# Altium integrated library SJ Passive Components.IntLib: 53 symbols
Pins are listed as number, name and electrical type; pins without a type are passive.

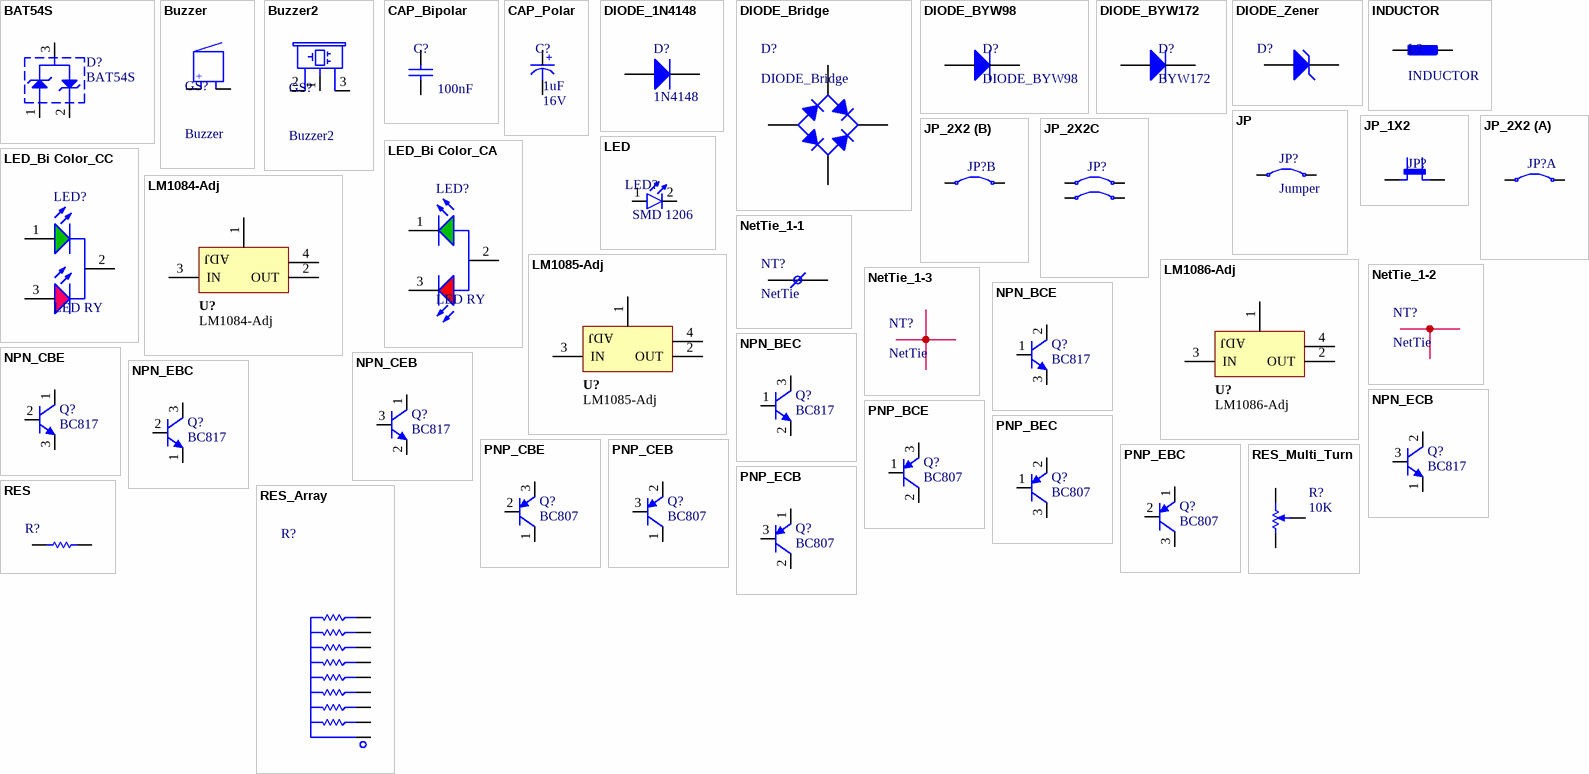
[diagram p0: symbols BAT54S to RES_Multi_Turn]

## BAT54S
designator D?
Schottky Barrier Double Diode; Company: SJ Libraries; Designer: Eng. Saeid Jorablo; Category: Diodes; ComponentLink1Description: Datasheet; ComponentLink2Description: Reference; ComponentLink2URL: http://altium-library.ir; HelpURL: http://s3.picofile.com/file/7443264187/Coming_Soon_logo.gif; Mounting Technology: Surface Mount; PackageDescription: SOT-23; 3 Leads; Body 3.0 x 2.6 mm, inc. leads (LxW max); PackageReference: SOT-23; Pin Count: 3; Publisher: SJ Unlimited; Status: Unreleased; Value: BAT54S
footprint SOT23_BEC_N (SOT23, 3-Leads, Body 2.9x1.3mm, Pitch 0.95mm, Lead Span 2.4mm, IPC Medium Density)
footprint SOT23_BEC_L (SOT23, 3-Leads, Body 2.9x1.3mm, Pitch 0.95mm, Lead Span 2.4mm, IPC High Density)
footprint SOT23_BEC_M (SOT23, 3-Leads, Body 2.9x1.3mm, Pitch 0.95mm, Lead Span 2.4mm, IPC Low Density)
signal-integrity model BAT54S
pins: 1 "Not Connected", 2 "Not Connected", 3 "Not Connected"

## Buzzer
designator GS?
Magnetic Transducer Buzzer; Company: SJ Libraries; Designer: Eng. Saeid Jorablo; PackageReference: ABSM-1574; PackageDescription: Magnetic Transducer Buzzer; Mounting Technology: Surface Mount\Through-Hole; ComponentLink1Description: Datasheet; Pin Count: 0; Category: MISC; HelpURL: http://s3.picofile.com/file/7443264187/Coming_Soon_logo.gif; ComponentLink2Description: Reference; Publisher: SJ Unlimited; Status: Unreleased
footprint BZ_SJ
footprint BZ_ABSM-1574 (Footprint not found)
footprint BZ_B/C11L
footprint BZ_B/C11S
footprint BZ_B/C14L
footprint BZ_B/C14S
footprint BZ_B/C17L
footprint BZ_B/C17S
footprint BZ_BMT1205XH7.5
footprint BZ_BPT-24X
footprint BZ_EB2209A
footprint BZ_EB2505
footprint BZ_EFBAA40D101
footprint BZ_EFBRD22C41
footprint BZ_EFBRD22C413
footprint BZ_EFBRD24C411
footprint BZ_F/BC35
footprint BZ_F/BC40
footprint BZ_F/CM04P
footprint BZ_F/CM12P
footprint BZ_F/DB18
footprint BZ_F/EB20P
footprint BZ_F/EE17P
footprint BZ_F/EE21P
footprint BZ_F/HGP
footprint BZ_F/HMB
footprint BZ_F/QMB
footprint BZ_F/QMBIII
footprint BZ_F/QMX
footprint BZ_F/TMB
pins: 1 + "Positive Pin", 2 - "Negative Pin"
4 alternate drawings of the same symbol

## Buzzer2
designator GS?
Magnetic Transducer Buzzer; Company: SJ Libraries; Designer: Eng. Saeid Jorablo; PackageReference: ABSM-1574; PackageDescription: Magnetic Transducer Buzzer; Mounting Technology: Surface Mount\Through-Hole; ComponentLink1Description: Datasheet; Pin Count: 0; Category: MISC; HelpURL: http://s3.picofile.com/file/7443264187/Coming_Soon_logo.gif; ComponentLink2Description: Reference; Publisher: SJ Unlimited; Status: Unreleased
footprint BZ_F/SU (BUZZER  Source: Spoerle)
footprint BZ_F/KMB (BUZZER  Source: Buerklin)
footprint BZ_F/CMB (BUZZER  Source: Buerklin)
pins: 1 C, 2 +, 3 -
1 alternate drawing of the same symbol

## CAP_Bipolar
designator C?, comment 100nF
Bipolar Capacitor; Voltage: 100V; Designer: Eng. Saeid Jorablo; Company: SJ Libraries; ComponentLink1Description: Datasheet; ComponentLink2Description: Reference; Publisher: SJ Unlimited; Mounting Technology: *; Mounting Technology: Surface Mount\Through-Hole; HelpURL: http://s3.picofile.com/file/7443264187/Coming_Soon_logo.gif; Status: Unreleased; Value: 100nF
footprint Cap - 100nF
signal-integrity model Cap (Bipolar Cap)
footprint Cap - 100nF - 2
footprint CAPC1005L (0402) (Chip Capacitor, Body 1.0x0.5mm, IPC High Density)
footprint CAPC1005M (0402) (Chip Capacitor, Body 1.0x0.5mm, IPC Low Density)
footprint CAPC1005N (0402) (Chip Capacitor, Body 1.0x0.5mm, IPC Medium Density)
footprint CAPC1608L (0603) (Chip Capacitor, Body 1.6x0.8mm, IPC High Density)
footprint CAPC1608M (0603) (Chip Capacitor, Body 1.6x0.8mm, IPC Low Density)
footprint CAPC1608N (0603) (Chip Capacitor, Body 1.6x0.8mm, IPC Medium Density)
footprint CAPC2012L (0805) (Chip Capacitor, Body 2.0x1.3mm, IPC High Density)
footprint CAPC2012M (0805) (Chip Capacitor, Body 2.0x1.3mm, IPC Low Density)
footprint CAPC2012N (0805) (Chip Capacitor, Body 2.0x1.3mm, IPC Medium Density)
footprint CAPC3216L (1206) (Chip Capacitor, Body 3.2x1.6mm, IPC High Density)
footprint CAPC3216M (1206) (Chip Capacitor, Body 3.2x1.6mm, IPC Low Density)
footprint CAPC3216N (1206) (Chip Capacitor, Body 3.2x1.6mm, IPC Medium Density)
footprint CAPC3225L (1210) (Chip Capacitor, Body 3.2x2.5mm, IPC High Density)
footprint CAPC3225M (1210) (Chip Capacitor, Body 3.2x2.5mm, IPC Low Density)
footprint CAPC3225N (1210) (Chip Capacitor, Body 3.2x2.5mm, IPC Medium Density)
pins: 1 +, 2 -

## CAP_Polar
designator C?, comment Voltage: 16V  (hidden comment: 1uF)
Polar Capacitor; Designer: Eng. Saeid Jorablo; Company: SJ Libraries; ComponentLink1Description: Datasheet; ComponentLink2Description: Reference; Publisher: SJ Unlimited; Mounting Technology: Surface Mount\Through-Hole; HelpURL: http://s3.picofile.com/file/7443264187/Coming_Soon_logo.gif; Status: Unreleased; Value: 1uF
footprint cap 00
footprint cap 01
footprint cap 02
footprint cap 03
footprint cap 04
footprint CAP 05
footprint CAPP 1206 (3216X18L) Size A (Chip Capacitor, 2-Leads, Body 3.2x1.6mm, IPC High Density, chip Tantalum)
signal-integrity model Cap (Polar Capacitor)
pins: 1 +, 2 -

## DIODE_1N4148
designator D?, comment 1N4148
High Conductance Fast Diode; Designer: Eng. Saeid Jorablo; Company: SJ Libraries; Published: 8-Jun-2000; LatestRevisionDate: 17-Jul-2002; LatestRevisionNote: Re-released for DXP Platform.; PackageReference: DO-35; Publisher: SJ Unlimited; PackageDescription: Diode, Axial; Body 3.8 x 1.9 mm (LxDia. max), Lead Dia. 0.53 mm (max); Code_JEDEC: DO-204-AH; ComponentLink1Description: Datasheet; ComponentLink1URL: http://www.fairchildsemi.com/; ComponentLink2Description: Reference; ComponentLink2URL: http://www.fairchildsemi.com/ds/1N%2F1N4148.pdf; Mounting Technology: Surface Mount\Through-Hole; HelpURL: http://s3.picofile.com/file/7443264187/Coming_Soon_logo.gif; Status: Unreleased
footprint DO-35 (Diode, Axial; Body 3.8 x 1.9 mm (LxDia. max), Lead Dia. 0.53 mm (max))
footprint LL4148 (MELF Diode, 2-Leads, Body 3.5x1.4mm, IPC Medium Density)
pins: 1 A, 2 K

## DIODE_Bridge
designator D?
Full Wave Diode Bridge; Company: SJ Libraries; Designer: Eng. Saeid Jorablo; Design Date: 2011/11/02; ComponentLink1Description: Datasheet; ComponentLink2Description: Reference; Publisher: SJ Unlimited; Mounting Technology: Surface Mount\Through-Hole; HelpURL: http://s3.picofile.com/file/7443264187/Coming_Soon_logo.gif; Status: Unreleased
footprint Bridge
footprint Diode Bridge
pins: 1 K, 2 C, 3 A, 4 C

## DIODE_BYW98
designator D?
HIGH EFFICIENCY FAST RECOVERY RECTIFIER DIODES; Designer: Eng. Saeid Jorablo; Company: SJ Libraries; IF(av): 3 A; Vrrm: 200 V; Trr (max): 35 ns; ComponentLink1Description: Datasheet; ComponentLink2Description: Reference; Publisher: SJ Unlimited; Mounting Technology: Surface Mount\Through-Hole; HelpURL: http://s3.picofile.com/file/7443264187/Coming_Soon_logo.gif; Status: Unreleased
footprint BYW98
pins: 1 A, 2 K

## DIODE_BYW172
designator D?, comment BYW172
Fast Avalanche Sinterglass Diode; 3A IF; VR 400V; Designer: Eng. Saeid Jorablo; Company: SJ Libraries; Vrrm: 200 V; Trr (max): 35 ns; IF(av): 3 A; ComponentLink1Description: Datasheet; ComponentLink2Description: Reference; Publisher: SJ Unlimited; Mounting Technology: Surface Mount\Through-Hole; HelpURL: http://s3.picofile.com/file/7443264187/Coming_Soon_logo.gif; Status: Unreleased
footprint BYW172
pins: 1 A, 2 K

## DIODE_Zener
designator D?  (value not drawn)
Zener Diode; Designer: Eng. Saeid Jorablo; Company: SJ Libraries; Voltage: 3.3 V; Design Date: 2011/11/02; ComponentLink1Description: Datasheet; ComponentLink2Description: Reference; Publisher: SJ Unlimited; Mounting Technology: Surface Mount\Through-Hole; HelpURL: http://s3.picofile.com/file/7443264187/Coming_Soon_logo.gif; Status: Unreleased
footprint Diode 1W
footprint Diode 1W_Stand
pins: 1 A, 2 K

## INDUCTOR
designator L?
Code_IEC: 1005; Designer: Eng. Saeid Jorablo; Company: SJ Libraries; Value: 10mH; Published: 8-Jun-2000; LatestRevisionDate: 29-May-2009; LatestRevisionNote: IPC-7351 Footprint Added.; PackageReference: 0402-A; Publisher: SJ Unlimited; PackageDescription: Chip Inductor; Code_JEITA: 0402; ComponentLink1Description: Datasheet; ComponentLink2Description: Reference; Mounting Technology: Surface Mount\Through-Hole; HelpURL: http://s3.picofile.com/file/7443264187/Coming_Soon_logo.gif; Status: Unreleased
footprint 0402-A (Chip Inductor, Body 1.0x0.5mm, IPC High Density)
footprint INDC1608L (Chip Inductor, Body 1.6x0.8mm, IPC High Density)
footprint 2029 (Chip Inductor, Body 2.0x1.2mm, IPC High Density)
footprint 0603 (Chip Inductor, Body 0.6x0.3mm, IPC High Density)
footprint INDC3216 (Chip Inductor, Body 3.2x1.6mm, IPC High Density)
footprint INDC4532 (Chip Inductor, Body 4.5x3.2mm, IPC High Density)
signal-integrity model Inductor
pins: 1, 2

## JP
designator JP?, comment Jumper
Jumper Component; Company: SJ Libraries; Designer: Eng. Saeid Jorablo; Category: Jumpers; ComponentLink1Description: Datasheet; ComponentLink2Description: Reference; HelpURL: http://s3.picofile.com/file/7443264187/Coming_Soon_logo.gif; Mounting Technology: Surface Mount\Through-Hole; Pin Count: 2; Publisher: SJ Unlimited; Status: Unreleased
footprint J0R/10 (0 Ohm Jumper Resistor)
footprint JP254_H (Jumper Header 2.54mm Pitch, Horizontal)
footprint JP254_V (Jumper Header 2.54mm Pitch, Vertical)
footprint SJ (SMD Jumper)
footprint SJW (SMD Jumper Wide)
footprint J0508-200 (5.08 mm (200mil) Jumper wire)
footprint J0762-300 (7.62 mm (300 mil) Jumper wire)
footprint J1016-400 (10.16 mm (400 mil) Jumper wire)
footprint J1270-500 (12.7 mm (500 mil) Jumper wire)
footprint J1524-600 (15.24 mm (600 mil) Jumper wire)
footprint J2032-800 (20.32 mm (800 mil) Jumper wire)
footprint J2540-1000 (25.4 mm (1000 mil) Jumper wire)
footprint J3048-1200 (30.48 mm (1200 mil) Jumper wire)
pins: 1, 2
4 alternate drawings of the same symbol

## JP_1X2
designator JP?, comment Jumper  (value not drawn)
1 X 02 Jumper; Company: SJ Libraries; Designer: Eng. Saeid Jorablo; Category: Jumpers; ComponentLink1Description: Datasheet; ComponentLink2Description: Reference; HelpURL: http://s3.picofile.com/file/7443264187/Coming_Soon_logo.gif; Mounting Technology: Surface Mount\Through-Hole; Pin Count: 2; Publisher: SJ Unlimited; Status: Unreleased
footprint JP254_H (Jumper Header 2.54mm Pitch, Horizontal)
footprint JP254_V (Jumper Header 2.54mm Pitch, Vertical)
pins: 1, 2
2 alternate drawings of the same symbol

## JP_2X2
designator JP?, comment Jumper  (value not drawn)
2 X 2 Jumper; Company: SJ Libraries; Designer: Eng. Saeid Jorablo; Category: Jumpers; ComponentLink1Description: Datasheet; ComponentLink2Description: Reference; HelpURL: http://s3.picofile.com/file/7443264187/Coming_Soon_logo.gif; Mounting Technology: Surface Mount\Through-Hole; Pin Count: 4; Publisher: SJ Unlimited; Status: Unreleased
footprint MHDR2X02-254P - E (Male Header 2X02 with 2.54 mm Pitch)
footprint MHDR2X02-200P - E (Male Header 2X02 with 2.00 mm Pitch)
part A pins: 1, 2
part B pins: 3, 4
2 alternate drawings of the same symbol

## JP_2X2C
designator JP?, comment Jumper  (value not drawn)
2 X 2 Jumper; Company: SJ Libraries; Designer: Eng. Saeid Jorablo; Category: Jumpers; ComponentLink1Description: Datasheet; ComponentLink2Description: Reference; HelpURL: http://s3.picofile.com/file/7443264187/Coming_Soon_logo.gif; Mounting Technology: Surface Mount\Through-Hole; Pin Count: 4; Publisher: SJ Unlimited; Status: Unreleased
footprint MHDR2X02-254P - E (Male Header 2X02 with 2.54 mm Pitch)
footprint MHDR2X02-200P - E (Male Header 2X02 with 2.00 mm Pitch)
pins: 1, 2, 3, 4
1 alternate drawing of the same symbol

## LED
designator LED?, comment Size: SMD 1206  (hidden comment: Red)
LED; Designer: Eng. Saeid Jorablo; Company: SJ Libraries; ComponentLink1Description: Datasheet; ComponentLink2Description: Reference; Publisher: SJ Unlimited; Mounting Technology: Surface Mount\Through-Hole; Color: Red; HelpURL: http://s3.picofile.com/file/7443264187/Coming_Soon_logo.gif; Status: Unreleased
footprint LED-3mm
footprint LED-5mm
footprint LED SMD 1206
footprint LED-RED (LED 3mm Right Angle - Color Red)
footprint LED-GREEN (LED 3mm Right Angle - Color Green)
footprint LED-YELLOW (LED 3mm Right Angle - Color Yellow)
footprint SMD_LED_0603_GREEN
footprint SMD_LED_0603_RED
footprint SMD_LED_0603_ORANGE
footprint SMD_LED_0603_YELLOW
pins: 1 A, 2 K
5 alternate drawings of the same symbol

## LED_Bi Color_CA
designator LED?, comment LED RY
Dual LED - Common Anode; Designer: Eng. Saeid Jorablo; Company: SJ Libraries; ComponentLink1Description: Datasheet; ComponentLink2Description: Reference; Publisher: SJ Unlimited; Mounting Technology: Surface Mount\Through-Hole; HelpURL: http://s3.picofile.com/file/7443264187/Coming_Soon_logo.gif; Status: Unreleased
pins: 1 A1, 2 K, 3 A2

## LED_Bi Color_CC
designator LED?, comment LED RY
Dual LED - Common Cothode; Designer: Eng. Saeid Jorablo; Company: SJ Libraries; ComponentLink1Description: Datasheet; ComponentLink2Description: Reference; Publisher: SJ Unlimited; Mounting Technology: Surface Mount\Through-Hole; HelpURL: http://s3.picofile.com/file/7443264187/Coming_Soon_logo.gif; Status: Unreleased
pins: 1 A1, 2 K, 3 A2

## LM1084-Adj
designator U?
LM1084-Adj, 5A Low Dropout Positive Adjustable Regulator; Max Input Voltage: 12V; Max Output Current: 5.1A; Max Output Voltage: mV; Min Input Voltage: -0.3V; Min Output Voltage: mV; Mounting Technology: Surface Mount; Status: Unreleased; Supply Voltage: mV; Temperature Range: -40 - 125 degC; Category: IC-Power
footprint TO254P-3N
pins: 1 ADJ, 2 OUT (power), 3 IN (power), 4 TAP

## LM1085-Adj
designator U?
LM1085-Adj, 3A Low Dropout Positive Adjustable Regulator; Max Input Voltage: 12V; Max Output Voltage: mV; Min Input Voltage: -0.3V; Max Output Current: 3A; Min Output Voltage: mV; Mounting Technology: Surface Mount; Status: Unreleased; Supply Voltage: mV; Temperature Range: -40 - 125 degC; Category: IC-Power
footprint TO254P-3N
pins: 1 ADJ, 2 OUT (power), 3 IN (power), 4

## LM1086-Adj
designator U?
LM1086-Adj, 1.5A Low Dropout Positive Adjustable Regulator; Max Input Voltage: 12V; Max Output Voltage: mV; Min Input Voltage: -0.3V; Max Output Current: 1.5A; Min Output Voltage: mV; Mounting Technology: Surface Mount; Status: Unreleased; Supply Voltage: mV; Temperature Range: -40 - 125 degC; Category: IC-Power
footprint TO254P-3N
pins: 1 ADJ, 2 OUT (power), 3 IN (power), 4

## NetTie_1-1
designator NT?, comment NetTie  (net tie, no BOM)
Net Tie One to One Connection; Company: SJ Libraries; Designer: Eng. Saeid Jorablo; HelpURL: http://s3.picofile.com/file/7443264187/Coming_Soon_logo.gif; ComponentLink1Description: Datasheet; ComponentLink2Description: Reference; Mounting Technology: Surface Mount\Through-Hole; Publisher: SJ Unlimited; Status: Unreleased
footprint NT_1-1_1 (NetTie One to One)
footprint NT_1-1_3 (NetTie One to One)
footprint NT_1-1_1 - small (NetTie One to One)
footprint NT_1-1_3 - small (NetTie One to One)
footprint NT_1X1X01 (NetTie One to One - 0.1mm width)
footprint NT_1X1X02 (NetTie One to One - 0.2mm width)
footprint NT_1X1X03 (NetTie One to One- 0.3mm width)
footprint NT_1X1X04 (NetTie One to One- 0.4mm width)
footprint NT_1X1X05 (NetTie One to One- 0.5mm width)
footprint NT_1X1X06 (NetTie One to One- 0.6mm width)
footprint NT_1X1X07 (NetTie One to One- 0.7mm width)
footprint NT_1X1X08 (NetTie One to One- 0.8mm width)
footprint NT_1X1X09 (NetTie One to One- 0.9mm width)
footprint NT_1X1X10 (NetTie One to One- 1.0mm width)
footprint NT_1X1X12 (NetTie One to One- 1.2mm width)
footprint NT_1X1X15 (NetTie One to One- 1.5mm width)
footprint NT_1X1X20 (NetTie One to One- 2.0mm width)
pins: 1 (power), 2 (power)
1 alternate drawing of the same symbol

## NetTie_1-2
designator NT?, comment NetTie  (net tie, no BOM)
Net Tie One to Two Connection; Company: SJ Libraries; Designer: Eng. Saeid Jorablo; HelpURL: http://s3.picofile.com/file/7443264187/Coming_Soon_logo.gif; ComponentLink1Description: Datasheet; ComponentLink2Description: Reference; Mounting Technology: Surface Mount\Through-Hole; Publisher: SJ Unlimited; Status: Unreleased
footprint NT_1-2_1 (NetTie One to Two)
footprint NT_1-2_2 (NetTie One to Two)
footprint NT_1-2_3 (NetTie One to Two)
footprint NT_1-2_4 (NetTie One to Two)
footprint NT_1-2_5 (NetTie One to Two)
footprint NT_1-2_6 (NetTie One to Two)
footprint NT_1-2_1 - small (NetTie One to Two)
footprint NT_1-2_2 - small (NetTie One to Two)
pins: 1 (power), 2 (power), 3 (power)
1 alternate drawing of the same symbol

## NetTie_1-3
designator NT?, comment NetTie  (net tie, no BOM)
Net Tie One to Two Connection; Company: SJ Libraries; Designer: Eng. Saeid Jorablo; HelpURL: http://s3.picofile.com/file/7443264187/Coming_Soon_logo.gif; ComponentLink1Description: Datasheet; ComponentLink2Description: Reference; Mounting Technology: Surface Mount\Through-Hole; Publisher: SJ Unlimited; Status: Unreleased
footprint NT_1-3_1 (NetTie One to Three)
footprint NT_1-3_1 - small (NetTie One to Two)
footprint NT_1-3_2 (NetTie One to Three)
footprint NT_1-3_2 - small (NetTie One to Two)
footprint NT_1-3_3 (NetTie One to Three)
footprint NT_1-3_4 (NetTie One to Three)
footprint NT_1-3_5 (NetTie One to Two)
pins: 1 (power), 2 (power), 3 (power), 4 (power)
1 alternate drawing of the same symbol

## NPN_BCE
designator Q?, comment BC817
NPN Bipolar Transistor; Designer: Eng. Saeid Jorablo; Company: SJ Libraries; Published: 8-Jun-2000; LatestRevisionDate: 29-May-2009; LatestRevisionNote: IPC-7351 Footprint Added.; PackageVersion: Aug-1999; PackageReference: SOT-23B; Publisher: SJ Unlimited; PackageDescription: 3-Pin SOT-23 Package 0.95 mm Pitch, 2.4 mm Lead Span; ComponentLink1Description: Datasheet; ComponentLink2Description: Reference; Mounting Technology: Surface Mount\Through-Hole; HelpURL: http://s3.picofile.com/file/7443264187/Coming_Soon_logo.gif; Status: Unreleased
footprint SOT23_BEC_L (SOT23, 3-Leads, Body 2.9x1.3mm, Pitch 0.95mm, Lead Span 2.4mm, IPC High Density)
footprint SOT23_BEC_M (SOT23, 3-Leads, Body 2.9x1.3mm, Pitch 0.95mm, Lead Span 2.4mm, IPC Low Density)
footprint SOT23_BEC_N (SOT23, 3-Leads, Body 2.9x1.3mm, Pitch 0.95mm, Lead Span 2.4mm, IPC Medium Density)
signal-integrity model NPN (NPN BJT Transistor)
pins: 1 B, 2 C, 3 E

## NPN_BEC
designator Q?, comment BC817
NPN Bipolar Transistor; Designer: Eng. Saeid Jorablo; Company: SJ Libraries; Published: 8-Jun-2000; LatestRevisionDate: 29-May-2009; LatestRevisionNote: IPC-7351 Footprint Added.; PackageVersion: Aug-1999; PackageReference: SOT-23B; Publisher: SJ Unlimited; PackageDescription: 3-Pin SOT-23 Package 0.95 mm Pitch, 2.4 mm Lead Span; ComponentLink1Description: Datasheet; ComponentLink2Description: Reference; Mounting Technology: Surface Mount\Through-Hole; HelpURL: http://s3.picofile.com/file/7443264187/Coming_Soon_logo.gif; Status: Unreleased
footprint SOT23_BEC_L (SOT23, 3-Leads, Body 2.9x1.3mm, Pitch 0.95mm, Lead Span 2.4mm, IPC High Density)
footprint SOT23_BEC_M (SOT23, 3-Leads, Body 2.9x1.3mm, Pitch 0.95mm, Lead Span 2.4mm, IPC Low Density)
footprint SOT23_BEC_N (SOT23, 3-Leads, Body 2.9x1.3mm, Pitch 0.95mm, Lead Span 2.4mm, IPC Medium Density)
signal-integrity model NPN (NPN BJT Transistor)
pins: 1 B, 2 E, 3 C

## NPN_CBE
designator Q?, comment BC817
NPN Bipolar Transistor; Designer: Eng. Saeid Jorablo; Company: SJ Libraries; Published: 8-Jun-2000; LatestRevisionDate: 29-May-2009; LatestRevisionNote: IPC-7351 Footprint Added.; PackageVersion: Aug-1999; PackageReference: SOT-23B; Publisher: SJ Unlimited; PackageDescription: 3-Pin SOT-23 Package 0.95 mm Pitch, 2.4 mm Lead Span; ComponentLink1Description: Datasheet; ComponentLink2Description: Reference; Mounting Technology: Surface Mount\Through-Hole; HelpURL: http://s3.picofile.com/file/7443264187/Coming_Soon_logo.gif; Status: Unreleased
footprint SOT23_BEC_L (SOT23, 3-Leads, Body 2.9x1.3mm, Pitch 0.95mm, Lead Span 2.4mm, IPC High Density)
footprint SOT23_BEC_M (SOT23, 3-Leads, Body 2.9x1.3mm, Pitch 0.95mm, Lead Span 2.4mm, IPC Low Density)
footprint SOT23_BEC_N (SOT23, 3-Leads, Body 2.9x1.3mm, Pitch 0.95mm, Lead Span 2.4mm, IPC Medium Density)
signal-integrity model NPN (NPN BJT Transistor)
pins: 1 C, 2 B, 3 E

## NPN_CEB
designator Q?, comment BC817
NPN Bipolar Transistor; Designer: Eng. Saeid Jorablo; Company: SJ Libraries; Published: 8-Jun-2000; LatestRevisionDate: 29-May-2009; LatestRevisionNote: IPC-7351 Footprint Added.; PackageVersion: Aug-1999; PackageReference: SOT-23B; Publisher: SJ Unlimited; PackageDescription: 3-Pin SOT-23 Package 0.95 mm Pitch, 2.4 mm Lead Span; ComponentLink1Description: Datasheet; ComponentLink2Description: Reference; Mounting Technology: Surface Mount\Through-Hole; HelpURL: http://s3.picofile.com/file/7443264187/Coming_Soon_logo.gif; Status: Unreleased
footprint SOT23_BEC_L (SOT23, 3-Leads, Body 2.9x1.3mm, Pitch 0.95mm, Lead Span 2.4mm, IPC High Density)
footprint SOT23_BEC_M (SOT23, 3-Leads, Body 2.9x1.3mm, Pitch 0.95mm, Lead Span 2.4mm, IPC Low Density)
footprint SOT23_BEC_N (SOT23, 3-Leads, Body 2.9x1.3mm, Pitch 0.95mm, Lead Span 2.4mm, IPC Medium Density)
signal-integrity model NPN (NPN BJT Transistor)
pins: 1 C, 2 E, 3 B

## NPN_EBC
designator Q?, comment BC817
NPN Bipolar Transistor; Designer: Eng. Saeid Jorablo; Company: SJ Libraries; Published: 8-Jun-2000; LatestRevisionDate: 29-May-2009; LatestRevisionNote: IPC-7351 Footprint Added.; PackageVersion: Aug-1999; PackageReference: SOT-23B; Publisher: SJ Unlimited; PackageDescription: 3-Pin SOT-23 Package 0.95 mm Pitch, 2.4 mm Lead Span; ComponentLink1Description: Datasheet; ComponentLink2Description: Reference; Mounting Technology: Surface Mount\Through-Hole; HelpURL: http://s3.picofile.com/file/7443264187/Coming_Soon_logo.gif; Status: Unreleased
footprint SOT23_BEC_L (SOT23, 3-Leads, Body 2.9x1.3mm, Pitch 0.95mm, Lead Span 2.4mm, IPC High Density)
footprint SOT23_BEC_M (SOT23, 3-Leads, Body 2.9x1.3mm, Pitch 0.95mm, Lead Span 2.4mm, IPC Low Density)
footprint SOT23_BEC_N (SOT23, 3-Leads, Body 2.9x1.3mm, Pitch 0.95mm, Lead Span 2.4mm, IPC Medium Density)
signal-integrity model NPN (NPN BJT Transistor)
pins: 1 E, 2 B, 3 C

## NPN_ECB
designator Q?, comment BC817
NPN Bipolar Transistor; Designer: Eng. Saeid Jorablo; Company: SJ Libraries; Published: 8-Jun-2000; LatestRevisionDate: 29-May-2009; LatestRevisionNote: IPC-7351 Footprint Added.; PackageVersion: Aug-1999; PackageReference: SOT-23B; Publisher: SJ Unlimited; PackageDescription: 3-Pin SOT-23 Package 0.95 mm Pitch, 2.4 mm Lead Span; ComponentLink1Description: Datasheet; ComponentLink2Description: Reference; Mounting Technology: Surface Mount\Through-Hole; HelpURL: http://s3.picofile.com/file/7443264187/Coming_Soon_logo.gif; Status: Unreleased
footprint SOT23_BEC_L (SOT23, 3-Leads, Body 2.9x1.3mm, Pitch 0.95mm, Lead Span 2.4mm, IPC High Density)
footprint SOT23_BEC_M (SOT23, 3-Leads, Body 2.9x1.3mm, Pitch 0.95mm, Lead Span 2.4mm, IPC Low Density)
footprint SOT23_BEC_N (SOT23, 3-Leads, Body 2.9x1.3mm, Pitch 0.95mm, Lead Span 2.4mm, IPC Medium Density)
signal-integrity model NPN (NPN BJT Transistor)
pins: 1 E, 2 C, 3 B

## PNP_BCE
designator Q?, comment BC807
PNP Bipolar Transistor; Designer: Eng. Saeid Jorablo; Company: SJ Libraries; Published: 8-Jun-2000; LatestRevisionDate: 29-May-2009; LatestRevisionNote: IPC-7351 Footprint Added.; PackageVersion: Aug-1999; PackageReference: SOT-23B; Publisher: SJ Unlimited; PackageDescription: 3-Pin SOT-23 Package 0.95 mm Pitch, 2.4 mm Lead Span; ComponentLink1Description: Datasheet; ComponentLink2Description: Reference; Mounting Technology: Surface Mount\Through-Hole; HelpURL: http://s3.picofile.com/file/7443264187/Coming_Soon_logo.gif; Status: Unreleased
signal-integrity model PNP
footprint SOT23_BEC_N (SOT23, 3-Leads, Body 2.9x1.3mm, Pitch 0.95mm, Lead Span 2.4mm, IPC Medium Density)
footprint SOT23_BEC_M (SOT23, 3-Leads, Body 2.9x1.3mm, Pitch 0.95mm, Lead Span 2.4mm, IPC Low Density)
footprint SOT23_BEC_L (SOT23, 3-Leads, Body 2.9x1.3mm, Pitch 0.95mm, Lead Span 2.4mm, IPC High Density)
pins: 1 B, 2 C, 3 E

## PNP_BEC
designator Q?, comment BC807
PNP Bipolar Transistor; Designer: Eng. Saeid Jorablo; Company: SJ Libraries; Published: 8-Jun-2000; LatestRevisionDate: 29-May-2009; LatestRevisionNote: IPC-7351 Footprint Added.; PackageVersion: Aug-1999; PackageReference: SOT-23B; Publisher: SJ Unlimited; PackageDescription: 3-Pin SOT-23 Package 0.95 mm Pitch, 2.4 mm Lead Span; ComponentLink1Description: Datasheet; ComponentLink2Description: Reference; Mounting Technology: Surface Mount\Through-Hole; HelpURL: http://s3.picofile.com/file/7443264187/Coming_Soon_logo.gif; Status: Unreleased
signal-integrity model PNP
footprint SOT23_BEC_N (SOT23, 3-Leads, Body 2.9x1.3mm, Pitch 0.95mm, Lead Span 2.4mm, IPC Medium Density)
footprint SOT23_BEC_M (SOT23, 3-Leads, Body 2.9x1.3mm, Pitch 0.95mm, Lead Span 2.4mm, IPC Low Density)
footprint SOT23_BEC_L (SOT23, 3-Leads, Body 2.9x1.3mm, Pitch 0.95mm, Lead Span 2.4mm, IPC High Density)
pins: 1 B, 2 E, 3 C

## PNP_CBE
designator Q?, comment BC807
PNP Bipolar Transistor; Designer: Eng. Saeid Jorablo; Company: SJ Libraries; Published: 8-Jun-2000; LatestRevisionDate: 29-May-2009; LatestRevisionNote: IPC-7351 Footprint Added.; PackageVersion: Aug-1999; PackageReference: SOT-23B; Publisher: SJ Unlimited; PackageDescription: 3-Pin SOT-23 Package 0.95 mm Pitch, 2.4 mm Lead Span; ComponentLink1Description: Datasheet; ComponentLink2Description: Reference; Mounting Technology: Surface Mount\Through-Hole; HelpURL: http://s3.picofile.com/file/7443264187/Coming_Soon_logo.gif; Status: Unreleased
signal-integrity model PNP
footprint SOT23_BEC_N (SOT23, 3-Leads, Body 2.9x1.3mm, Pitch 0.95mm, Lead Span 2.4mm, IPC Medium Density)
footprint SOT23_BEC_M (SOT23, 3-Leads, Body 2.9x1.3mm, Pitch 0.95mm, Lead Span 2.4mm, IPC Low Density)
footprint SOT23_BEC_L (SOT23, 3-Leads, Body 2.9x1.3mm, Pitch 0.95mm, Lead Span 2.4mm, IPC High Density)
pins: 1 C, 2 B, 3 E

## PNP_CEB
designator Q?, comment BC807
PNP Bipolar Transistor; Designer: Eng. Saeid Jorablo; Company: SJ Libraries; Published: 8-Jun-2000; LatestRevisionDate: 29-May-2009; LatestRevisionNote: IPC-7351 Footprint Added.; PackageVersion: Aug-1999; PackageReference: SOT-23B; Publisher: SJ Unlimited; PackageDescription: 3-Pin SOT-23 Package 0.95 mm Pitch, 2.4 mm Lead Span; ComponentLink1Description: Datasheet; ComponentLink2Description: Reference; Mounting Technology: Surface Mount\Through-Hole; HelpURL: http://s3.picofile.com/file/7443264187/Coming_Soon_logo.gif; Status: Unreleased
signal-integrity model PNP
footprint SOT23_BEC_N (SOT23, 3-Leads, Body 2.9x1.3mm, Pitch 0.95mm, Lead Span 2.4mm, IPC Medium Density)
footprint SOT23_BEC_M (SOT23, 3-Leads, Body 2.9x1.3mm, Pitch 0.95mm, Lead Span 2.4mm, IPC Low Density)
footprint SOT23_BEC_L (SOT23, 3-Leads, Body 2.9x1.3mm, Pitch 0.95mm, Lead Span 2.4mm, IPC High Density)
pins: 1 C, 2 E, 3 B

## PNP_EBC
designator Q?, comment BC807
PNP Bipolar Transistor; Designer: Eng. Saeid Jorablo; Company: SJ Libraries; Published: 8-Jun-2000; LatestRevisionDate: 29-May-2009; LatestRevisionNote: IPC-7351 Footprint Added.; PackageVersion: Aug-1999; PackageReference: SOT-23B; Publisher: SJ Unlimited; PackageDescription: 3-Pin SOT-23 Package 0.95 mm Pitch, 2.4 mm Lead Span; ComponentLink1Description: Datasheet; ComponentLink2Description: Reference; Mounting Technology: Surface Mount\Through-Hole; HelpURL: http://s3.picofile.com/file/7443264187/Coming_Soon_logo.gif; Status: Unreleased
signal-integrity model PNP
footprint SOT23_BEC_N (SOT23, 3-Leads, Body 2.9x1.3mm, Pitch 0.95mm, Lead Span 2.4mm, IPC Medium Density)
footprint SOT23_BEC_M (SOT23, 3-Leads, Body 2.9x1.3mm, Pitch 0.95mm, Lead Span 2.4mm, IPC Low Density)
footprint SOT23_BEC_L (SOT23, 3-Leads, Body 2.9x1.3mm, Pitch 0.95mm, Lead Span 2.4mm, IPC High Density)
pins: 1 E, 2 B, 3 C

## PNP_ECB
designator Q?, comment BC807
PNP Bipolar Transistor; Designer: Eng. Saeid Jorablo; Company: SJ Libraries; Published: 8-Jun-2000; LatestRevisionDate: 29-May-2009; LatestRevisionNote: IPC-7351 Footprint Added.; PackageVersion: Aug-1999; PackageReference: SOT-23B; Publisher: SJ Unlimited; PackageDescription: 3-Pin SOT-23 Package 0.95 mm Pitch, 2.4 mm Lead Span; ComponentLink1Description: Datasheet; ComponentLink2Description: Reference; Mounting Technology: Surface Mount\Through-Hole; HelpURL: http://s3.picofile.com/file/7443264187/Coming_Soon_logo.gif; Status: Unreleased
signal-integrity model PNP
footprint SOT23_BEC_N (SOT23, 3-Leads, Body 2.9x1.3mm, Pitch 0.95mm, Lead Span 2.4mm, IPC Medium Density)
footprint SOT23_BEC_M (SOT23, 3-Leads, Body 2.9x1.3mm, Pitch 0.95mm, Lead Span 2.4mm, IPC Low Density)
footprint SOT23_BEC_L (SOT23, 3-Leads, Body 2.9x1.3mm, Pitch 0.95mm, Lead Span 2.4mm, IPC High Density)
pins: 1 E, 2 C, 3 B

## RES
designator R?, comment 1K  (value not drawn)
Resistor; Designer: Eng. Saeid Jorablo; Company: SJ Libraries; Tolerance: 5%; Power: 1/8 W; Category: Resistors; ComponentLink1Description: Datasheet; ComponentLink2Description: Reference; PackageDescription: SMD & TH Resistors; Publisher: SJ Unlimited; Mounting Technology: Surface Mount\Through-Hole; HelpURL: http://s3.picofile.com/file/7443264187/Coming_Soon_logo.gif; Status: Unreleased; Value: 1K
simulation model Resistor
footprint Res-(1/8)
footprint Res-(1/4)
footprint Res-(1/2)
footprint Res-(1/1)
footprint Res-(2/1)
footprint Res-(1/4)-Stand
footprint Res-(5/1)-Stand
signal-integrity model Resistor
footprint RESC0603L (0201) (Chip Resistor, Body 0.6x0.3mm, IPC High Density)
footprint RESC0603M (0201) (Chip Resistor, Body 0.6x0.3mm, IPC Low Density)
footprint RESC0603N (0201) (Chip Resistor, Body 0.6x0.3mm, IPC Medium Density)
footprint RESC1005L (0402) (Chip Resistor, Body 1.1x0.5mm, IPC High Density)
footprint RESC1005M (0402) (Chip Resistor, Body 1.1x0.5mm, IPC Low Density)
footprint RESC1005N (0402) (Chip Resistor, Body 1.1x0.5mm, IPC Medium Density)
footprint RESC1608L (0603) (Chip Resistor, Body 1.6x0.8mm, IPC High Density)
footprint RESC1608M (0603) (Chip Resistor, Body 1.6x0.8mm, IPC Low Density)
footprint RESC1608N (0603) (Chip Resistor, Body 1.6x0.8mm, IPC Medium Density)
footprint RESC2012L (0805) (Chip Resistor, Body 2.0x1.3mm, IPC High Density)
footprint RESC2012M (0805) (Chip Resistor, Body 2.0x1.3mm, IPC Low Density)
footprint RESC2012N (0805) (Chip Resistor, Body 2.0x1.3mm, IPC Medium Density)
footprint RESC3216X60L (1206) (Chip Resistor, Body 3.2x1.6x0.60 mm, IPC High Density)
footprint RESC3216X60M (1206) (Chip Resistor, Body 3.2x1.6x0.60mm, IPC Low Density)
footprint RESC3216X60N (1206) (Chip Resistor, Body 3.2x1.6x0.60 mm, IPC Medium Density)
footprint RESC3216X84L (1206) (Chip Resistor, Body 3.2x1.6x0.84 mm, IPC High Density)
footprint RESC3216X84M (1206) (Chip Resistor, Body 3.2x1.6x0.84mm, IPC Low Density)
footprint RESC3216X84N (1206) (Chip Resistor, Body 3.2x1.6x0.84 mm, IPC Medium Density)
footprint RESC3225L (1210) (Chip Resistor, Body 3.2x2.5mm, IPC High Density)
footprint RESC3225M (1210) (Chip Resistor, Body 3.2x2.5mm, IPC Low Density)
footprint RESC3225N (1210) (Chip Resistor, Body 3.2x2.5mm, IPC Medium Density)
footprint RESC5025L (2010) (Chip Resistor, Body 5.0x2.5mm, IPC High Density)
footprint RESC5025M (2010) (Chip Resistor, Body 5.0x2.5mm, IPC Low Density)
footprint RESC5025N (2010) (Chip Resistor, Body 5.0x2.5mm, IPC Medium Density)
pins: 1, 2
1 alternate drawing of the same symbol

## RES_Array
designator R?, comment 1K  (value not drawn)
Resistor Pack; Designer: Eng. Saeid Jorablo; Power: 1/4W; Tolerance: 5%; Company: SJ Libraries; Category: Resistors; ComponentLink1Description: Datasheet; ComponentLink2Description: Reference; PackageDescription: TH; Publisher: SJ Unlimited; Mounting Technology: Surface Mount\Through-Hole; Value: 1K; HelpURL: http://s3.picofile.com/file/7443264187/Coming_Soon_logo.gif; Status: Unreleased
footprint Res Array
signal-integrity model Res Array (Resistor Array)
pins: 1 (power), 2, 3, 4, 5, 6, 7, 8, 9
1 alternate drawing of the same symbol

## RES_Multi_Turn
designator R?, comment 10K
Square Trimming Potentiometer; Designer: Eng. Saeid Jorablo; Company: SJ Libraries; Published: 17-Dec-2003; PackageReference: POT4MM-2; Publisher: SJ Unlimited; PackageDescription: Square Trimming Potentiometer; ComponentLink1Description: Datasheet; ComponentLink1URL: http://bourns.com/2/search.html; ComponentLink2Description: Reference; Mounting Technology: Surface Mount\Through-Hole; HelpURL: http://s3.picofile.com/file/7443264187/Coming_Soon_logo.gif; Status: Unreleased; Value: 10K
footprint 3296P
footprint 3296W
footprint 3296X
footprint 3296Y
footprint 3296Z
footprint SMD_3223G
footprint SMD_3223J
footprint SMD_3223W
footprint SMD_PVG5H
footprint SMD_SM-42/43A
footprint SMD_SM-42/43B
footprint SMD_SM-42/43W
footprint SMD_SM-42/43X
pins: 1 CCW, 2 WIPER, 3 CW
3 alternate drawings of the same symbol

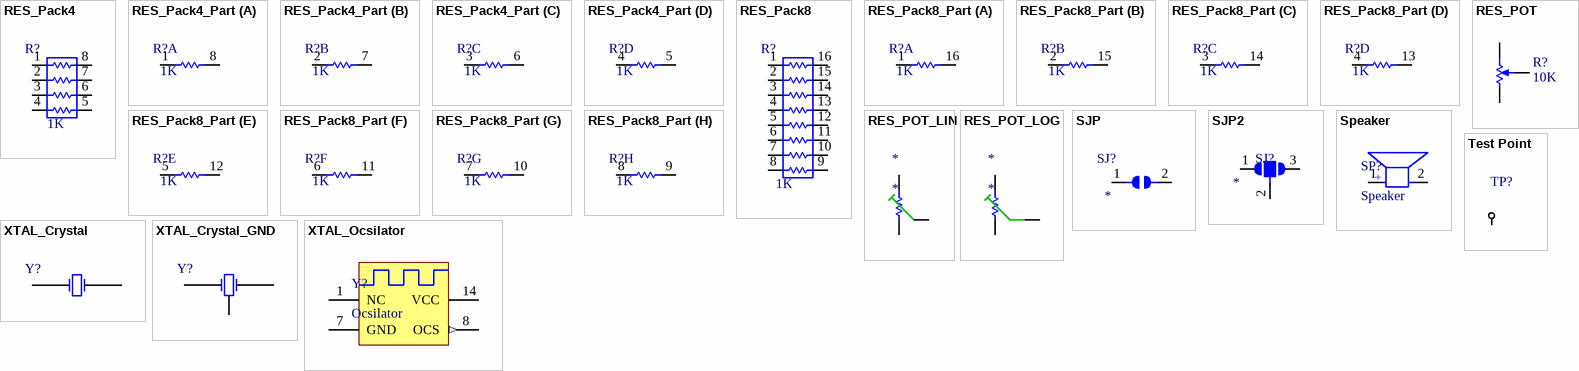
[diagram p1: symbols RES_Pack4 to XTAL_Ocsilator]

## RES_Pack4
designator R?, comment 1K
Isolated 4-Resistor Network; Company: SJ Libraries; Designer: Eng. Saeid Jorablo; Power: 1/8 W; Tolerance: 5%; ComponentLink1Description: Datasheet; ComponentLink2Description: Reference; Publisher: SJ Unlimited; Mounting Technology: Surface Mount\Through-Hole; HelpURL: http://s3.picofile.com/file/7443264187/Coming_Soon_logo.gif; Status: Unreleased; Value: 1K
signal-integrity model Res_Pack4 (Resistor Network Pack 4)
pins: 1, 2, 3, 4, 5, 6, 7, 8

## RES_Pack4_Part
designator R?, comment 1K
Isolated 4-Resistor Network - Parts; Designer: Eng. Saeid Jorablo; Power: 1/8 W; Tolerance: 5%; Company: SJ Libraries; Category: Resistors; ComponentLink1Description: Datasheet; ComponentLink2Description: Reference; PackageDescription: SMD; Publisher: SJ Unlimited; Mounting Technology: Surface Mount\Through-Hole; HelpURL: http://s3.picofile.com/file/7443264187/Coming_Soon_logo.gif; Status: Unreleased; Value: 1K
simulation model Resistor
signal-integrity model Resistor
part A pins: 1, 8
part B pins: 2, 7
part C pins: 3, 6
part D pins: 4, 5

## RES_Pack8
designator R?, comment 1K
Isolated 8-Resistor Network; Company: SJ Libraries; Designer: Eng. Saeid Jorablo; Power: 1/8W; Tolerance: 5%; ComponentLink1Description: Datasheet; ComponentLink2Description: Reference; Publisher: SJ Unlimited; Mounting Technology: Surface Mount\Through-Hole; HelpURL: http://s3.picofile.com/file/7443264187/Coming_Soon_logo.gif; Status: Unreleased; Value: 1K
signal-integrity model Res_Pack8 (Resistor Network Pack 8)
pins: 1, 2, 3, 4, 5, 6, 7, 8, 9, 10, 11, 12, 13, 14, 15, 16

## RES_Pack8_Part
designator R?, comment 1K
Isolated 8-Resistor Network - Parts; Designer: Eng. Saeid Jorablo; Power: 1/8 W; Tolerance: 5%; Company: SJ Libraries; Category: Resistors; ComponentLink1Description: Datasheet; ComponentLink2Description: Reference; PackageDescription: SMD SOIC & SOP; Publisher: SJ Unlimited; Mounting Technology: Surface Mount\Through-Hole; HelpURL: http://s3.picofile.com/file/7443264187/Coming_Soon_logo.gif; Status: Unreleased; Value: 1K
simulation model Resistor
signal-integrity model Res_Pack8 (Resistor Network Pack 8)
part A pins: 1, 16
part B pins: 2, 15
part C pins: 3, 14
part D pins: 4, 13
part E pins: 5, 12
part F pins: 6, 11
part G pins: 7, 10
part H pins: 8, 9

## RES_POT
designator R?, comment 10K
Square Trimming Potentiometer; Designer: Eng. Saeid Jorablo; Company: SJ Libraries; Published: 17-Dec-2003; PackageReference: POT4MM-2; Publisher: SJ Unlimited; PackageDescription: Square Trimming Potentiometer; ComponentLink1Description: Datasheet; ComponentLink1URL: http://bourns.com/2/search.html; ComponentLink2Description: Reference; Mounting Technology: Surface Mount\Through-Hole; HelpURL: http://s3.picofile.com/file/7443264187/Coming_Soon_logo.gif; Status: Unreleased; Value: 10K
footprint 3RP/1610N
footprint 3296P
footprint 3296W
footprint 3296X
footprint 3296Y
footprint 3296Z
footprint 3306F
footprint EVUF
footprint SMD_3223G
footprint SMD_3223J
footprint SMD_3223W
footprint SMD_PVG3A
footprint SMD_PVG5H
footprint SMD_PVZ3A
footprint SMD_SM-42/43A
footprint SMD_SM-42/43B
footprint SMD_SM-42/43W
footprint SMD_SM-42/43X
footprint 3306P
footprint 3306W
footprint 3306K
pins: 1 CCW, 2 WIPER, 3 CW
3 alternate drawings of the same symbol

## RES_POT_LIN
designator *
footprint 3RP/1610N
footprint 3296P
footprint 3296W
footprint 3296X
footprint 3296Y
footprint 3296Z
footprint 3306F
footprint EVUF
footprint SMD_3223G
footprint SMD_3223J
footprint SMD_3223W
footprint SMD_PVG3A
footprint SMD_PVG5H
footprint SMD_PVZ3A
footprint SMD_SM-42/43A
footprint SMD_SM-42/43B
footprint SMD_SM-42/43W
footprint SMD_SM-42/43X
footprint 3306P
footprint 3306W
footprint 3306K
pins: 1 CCW, 2 WIPER, 3 CW
1 alternate drawing of the same symbol

## RES_POT_LOG
designator *
footprint 3RP/1610N
footprint 3296P
footprint 3296W
footprint 3296X
footprint 3296Y
footprint 3296Z
footprint 3306F
footprint EVUF
footprint SMD_3223G
footprint SMD_3223J
footprint SMD_3223W
footprint SMD_PVG3A
footprint SMD_PVG5H
footprint SMD_PVZ3A
footprint SMD_SM-42/43A
footprint SMD_SM-42/43B
footprint SMD_SM-42/43W
footprint SMD_SM-42/43X
footprint 3306P
footprint 3306W
footprint 3306K
pins: 1 CCW, 2 WIPER, 3 CW
1 alternate drawing of the same symbol

## SJP
designator SJ?
footprint SJ (Solder jumper)
footprint SJW
pins: 1, 2

## SJP2
designator SJ?
footprint SJ_2 (Solder jumper)
footprint SJ_2W
pins: 1, 2, 3

## Speaker
designator SP?
Company: SJ Libraries; Designer: Eng. Saeid Jorablo; ComponentLink1Description: Datasheet; ComponentLink2Description: Reference; HelpURL: http://s3.picofile.com/file/7443264187/Coming_Soon_logo.gif; Mounting Technology: Surface Mount\Through-Hole; Publisher: SJ Unlimited; Status: Unreleased
footprint SP_AL11P
footprint SP_AL23P
footprint SP_AL30P
footprint SP_AL60P
footprint SP_AL201P
footprint SP_F/PMX04A
footprint SP_KSS1201
pins: 1 + "Positive Pin", 2 - "Negative Pin"
1 alternate drawing of the same symbol

## Test Point
designator TP?
Test Point; Company: SJ Libraries; Designer: Eng. Saeid Jorablo; Mounting Technology: Surface Mount\Through-Hole; ComponentLink1Description: Datasheet; Pin Count: 0; Update Date: 6/3/2012; Category: MISC; HelpURL: http://s3.picofile.com/file/7443264187/Coming_Soon_logo.gif
footprint TP19 (Round SMD Test Pin; 1.9 mm)
footprint TP07SQ (Square SMD Test Pin; 0.7 mm)
footprint TP08SQ (Square SMD Test Pin; 0.8 mm)
footprint TP07 (Round SMD Test Pin; 0.7 mm)
footprint TP10SQ (Square SMD Test Pin; 1.0 mm)
footprint TP06SQ (Square SMD Test Pin; 0.6 mm)
footprint TP11SQ (Square SMD Test Pin; 1.1 mm)
footprint TP12SQ (Square SMD Test Pin; 1.2 mm)
footprint TP13SQ (Square SMD Test Pin; 1.3 mm)
footprint TP14SQ (Square SMD Test Pin; 1.4 mm)
footprint TP15SQ (Square SMD Test Pin; 1.5 mm)
footprint TP16SQ (Square SMD Test Pin; 1.6 mm)
footprint TP17SQ (Square SMD Test Pin; 1.7 mm)
footprint TP18SQ (Square SMD Test Pin; 1.8 mm)
footprint TP19SQ (Square SMD Test Pin; 1.9 mm)
footprint TP20SQ (Square SMD Test Pin; 2.0 mm)
footprint TP06 (Round SMD Test Pin; 0.6 mm)
footprint TP20 (Round SMD Test Pin; 2.0 mm)
footprint TP18 (Round SMD Test Pin; 1.8 mm)
footprint TP17 (Round SMD Test Pin; 1.7 mm)
footprint TP16 (Round SMD Test Pin; 1.6 mm)
footprint TP15 (Round SMD Test Pin; 1.5 mm)
footprint TP14 (Round SMD Test Pin; 1.4 mm)
footprint TP13 (Round SMD Test Pin; 1.3 mm)
footprint TP12 (Round SMD Test Pin; 1.2 mm)
footprint TP11 (Round SMD Test Pin; 1.1 mm)
footprint TP10 (Round SMD Test Pin; 1.0 mm)
footprint TP09 (Round SMD Test Pin; 0.9 mm)
footprint TP09SQ (Square SMD Test Pin; 0.9 mm)
footprint TP08 (Round SMD Test Pin; 0.8 mm)
footprint Test Point
footprint Test Point Small
footprint TP-40P (Testpoint - 40 mil Hole Size)
pins: 1 TP
1 alternate drawing of the same symbol

## XTAL_Crystal
designator Y?, comment 11.0592 MHz  (value not drawn)
XTAL Crystal; Company: SJ Libraries; Designer: Eng. Saeid Jorablo; Design Date: 11/04/2011; ComponentLink1Description: Datasheet; ComponentLink2Description: Reference; Publisher: SJ Unlimited; Mounting Technology: Surface Mount\Through-Hole; Value: 11.0592 MHz; HelpURL: http://s3.picofile.com/file/7443264187/Coming_Soon_logo.gif; Status: Unreleased
footprint Crystal SMD
footprint XTAL
footprint XTAL Small
footprint XTAL RTC - V
footprint XTAL RTC - H
footprint SMD_XTAL RTC - H
footprint SMD_ABS07
pins: 1 OSC1, 2 OSC2

## XTAL_Crystal_GND
designator Y?, comment 11.0592 MHz  (value not drawn)
XTAL Crystal; Company: SJ Libraries; Designer: Eng. Saeid Jorablo; Design Date: 11/04/2011; ComponentLink1Description: Datasheet; ComponentLink2Description: Reference; Publisher: SJ Unlimited; Mounting Technology: Surface Mount\Through-Hole; Value: 11.0592 MHz; HelpURL: http://s3.picofile.com/file/7443264187/Coming_Soon_logo.gif; Status: Unreleased
footprint XTAL Small - GND
footprint XTAL RTC - H - GND (Footprint not found)
pins: 1 OSC1, 2 OSC2, 3 (power)

## XTAL_Ocsilator
designator Y?, comment Ocsilator
Crystal Ocsilator; Designer: Eng. Saeid Jorablo; Company: SJ Libraries; Value: 1M; ComponentLink1Description: Datasheet; ComponentLink1URL: http://scrltd.co.il/admin/products/technicalFile/SCO-020.pdf; ComponentLink2Description: Reference; Publisher: SJ Unlimited; Mounting Technology: Surface Mount\Through-Hole; HelpURL: http://s3.picofile.com/file/7443264187/Coming_Soon_logo.gif; Status: Unreleased
footprint OCS
signal-integrity model Model Name (Model Description)
pins: 1 NC, 7 GND (power), 8 OCS (out), 14 VCC (power)